# Altium footprint library CADTcommon.PcbLib: 503 footprints (part 2 of 32)
Each footprint in its own frame and in the unit in brackets; x right, y up, seen from the top. Pads: shape width x height; smd on the part's side, far side on the other; paste and mask are expansions set on the pad; w line width, h text height; cw(c..) or ccw(c..) is an arc to the next point about the centre after c.
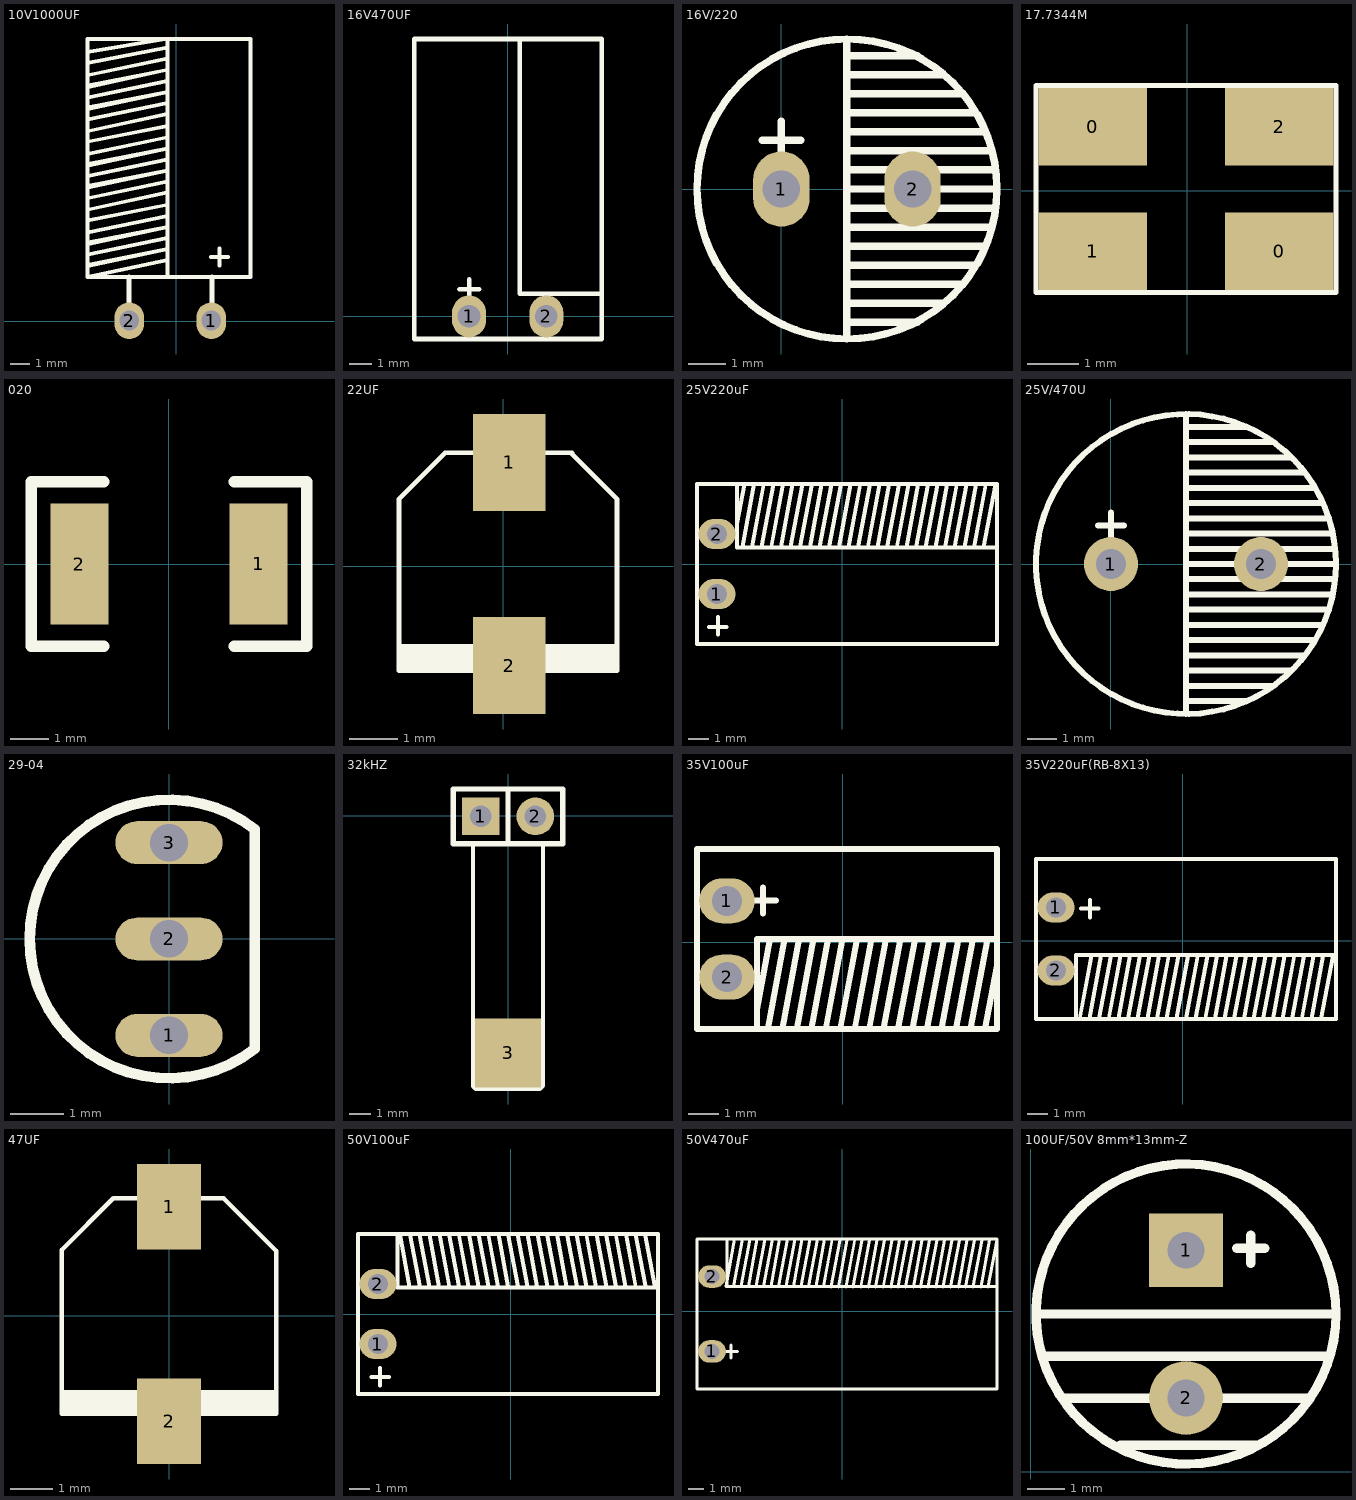
[diagram p1: the footprints below, top view; thin cyan lines are the x and y axes]

## 10V1000UF [mm]
pads (2):
  oval 1.5x1.85 hole 1: 1(1.778,0.025) 2(-2.362,0.025)
Top Overlay:
  lines w0.2: -4.47,2.845 -0.432,3.632 -4.445,2.769 ; -4.47,4.47 -0.432,5.309 ; -4.47,5.08 -0.432,5.867 ; -4.47,5.613 -0.457,6.477 ; -4.47,6.198 -0.432,7.036 ; -4.47,6.807 -0.432,7.595 -4.445,6.731 ; -4.47,8.433 -0.432,9.271 ; -4.47,9.042 -0.432,9.83 ; -4.47,9.576 -0.457,10.439 ; -4.47,10.16 -0.432,10.998 ; -4.47,10.77 -0.432,11.557 -4.445,10.693 ; -4.47,12.395 -0.432,13.233 ; -4.47,13.005 -0.432,13.792 ; -4.47,13.564 -0.559,14.224 ; -4.445,3.353 -0.441,4.184 ; -4.445,3.962 -0.432,4.75 -4.42,3.886 ; -4.445,7.315 -0.441,8.146 ; -4.445,7.925 -0.432,8.712 -4.42,7.849 ; -4.445,11.278 -0.441,12.109 ; -4.445,11.887 -0.432,12.675 -4.42,11.811 ; -0.432,3.073 -4.47,2.235 ; -0.432,14.199 -0.432,2.235 ; 1.768,3.226 2.631,3.226 ; 2.2,2.794 2.2,3.658 ; -4.47,2.235 -4.47,14.224 3.759,14.224 3.759,2.235 -0.432,2.235 ; -4.47,2.235 -0.432,2.235
  lines w0.254: -2.362,0.025 -2.362,2.235 ; 1.778,0.025 1.803,0.051 1.803,2.235 1.803,0.937
3D body: height 8, standoff -2.8, extent -4.404,-0.105 3.632,13.82

## 16V470UF [mm]
pads (2):
  oval 1.5x1.85 hole 1: 1(-1.702,0) 2(1.702,0)
Top Overlay:
  lines w0.2: -2.123,1.201 -1.26,1.201 ; -1.692,0.769 -1.692,1.633 ; 0.533,12.217 0.533,1.004 4.14,1.004 ; -4.115,-0.996 -4.115,12.217 4.14,12.217 4.14,-0.996 -4.115,-0.996

## 16V/220 [mm] "RB-8"
pads (2):
  oval 1.5x2 hole 1: 1(0,0) 2(3.5,0)
Top Overlay:
  circle w0.2: c1.75,0 r4
  lines w0.2: -0.505,1.295 0.511,1.295 ; 0.003,0.787 0.003,1.803 ; 1.75,-4 1.75,4 ; 1.75,-3.556 3.617,-3.556 ; 1.75,-3.048 4.329,-3.048 ; 1.75,-2.54 4.786,-2.54 ; 1.75,-2.032 5.167,-2.032 ; 1.75,-1.524 5.421,-1.524 ; 1.75,-1.016 5.599,-1.016 ; 1.75,-0.508 5.675,-0.508 ; 1.75,0 5.75,0 ; 1.75,0.508 5.675,0.508 ; 1.75,1.016 5.599,1.016 ; 1.75,1.524 5.421,1.524 ; 1.75,2.032 5.167,2.032 ; 1.75,2.54 4.786,2.54 ; 1.75,3.048 4.329,3.048 ; 1.75,3.556 3.617,3.556

## 17.7344M [mm]
pads (4):
  rect 2.1x1.5 smd: 0(-1.821,1.232) 0(1.779,-1.168) 1(-1.821,-1.168) 2(1.779,1.232)
Top Overlay:
  lines w0.1: -2.921,-1.968 -2.921,2.032 2.879,2.032 2.879,-1.968 -2.921,-1.968

## 020 [mil] "F"
pads (2):
  rect 60x125 smd: 1(92.5,0) 2(-92.5,0)
Top Overlay:
  lines w12: -67.5,-85 -142.5,-85 -142.5,85 -67.5,85 ; 67.5,-85 142.5,-85 142.5,85 67.5,85
3D body: height 36.61, standoff 0, extent -90.54,-63.3 90.56,63

## 22UF [mm] "C_LV_3"
pads (2):
  rect 1.5x2 smd: 1(0.127,2.151) 2(0.127,-2.049)
Top Overlay:
  lines w0.1: -2.148,-2.049 2.352,-2.049 ; -2.148,-1.999 2.352,-1.999 ; -2.148,-1.949 2.352,-1.949 ; -2.148,-1.849 2.352,-1.849 ; -2.148,-1.749 2.352,-1.749 ; -2.148,-1.699 2.352,-1.699 ; -2.148,-1.649 2.352,-1.649 ; -1.198,2.351 -2.148,1.401 -2.148,-2.149 2.352,-2.149 2.352,1.401 1.402,2.351 ; -1.173,2.351 1.427,2.351 ; -2.148,-1.899 2.352,-1.899 -2.148,-1.899 ; -2.148,-1.799 2.352,-1.799 -2.148,-1.799

## 25V220uF [mm]
pads (2):
  oval 1.85x1.5 hole 1: 1(-6.273,-1.486) 2(-6.273,1.514)
Top Overlay:
  lines w0.2: -6.664,-3.123 -5.8,-3.123 ; -6.232,-3.504 -6.232,-2.64 ; -5.273,4.014 -5.273,0.838 7.727,0.838 ; -5.272,2.039 -4.902,4.016 ; -5.008,0.864 -4.42,4.014 ; -4.526,0.863 -3.937,4.013 ; -4.043,0.862 -3.454,4.012 ; -3.561,0.861 -2.972,4.011 ; -3.078,0.86 -2.489,4.01 ; -2.595,0.858 -2.007,4.008 ; -2.113,0.857 -1.524,4.007 ; -1.63,0.856 -1.041,4.006 ; -1.148,0.855 -0.559,4.005 ; -0.665,0.854 -0.076,4.004 ; -0.182,0.852 0.406,4.002 ; 0.3,0.851 0.889,4.001 ; 0.783,0.85 1.372,4 ; 1.265,0.849 1.854,3.999 ; 1.748,0.848 2.337,3.998 ; 2.231,0.846 2.819,3.996 ; 2.713,0.845 3.302,3.995 ; 3.196,0.844 3.785,3.994 ; 3.678,0.843 4.267,3.993 ; 4.161,0.842 4.75,3.992 ; 4.644,0.84 5.232,3.99 ; 5.126,0.839 5.715,3.989 ; 5.609,0.838 6.198,3.988 ; 6.091,0.837 6.68,3.987 ; 7.057,0.834 7.645,3.984 ; -7.273,-3.986 -7.273,4.014 7.727,4.014 7.727,-3.986 -7.273,-3.986 ; 6.574,0.836 7.163,3.986 6.574,0.836
3D body: height 8, standoff -2.8, extent -6.556,-3.972 7.369,4.064

## 25V/470U [mm] "RB-10"
pads (2):
  round 1.8 hole 1: 1(0,0) 2(5,0)
Top Overlay:
  circle w0.2: c2.5,0 r5
  lines w0.2: -0.437,1.277 0.426,1.277 ; -0.005,0.845 -0.005,1.708 ; 2.5,-5 2.5,5 ; 2.5,-4.572 4.51,-4.572 ; 2.5,-4.064 5.374,-4.064 ; 2.5,-3.556 6.009,-3.556 ; 2.5,-3.048 6.441,-3.048 ; 2.5,-2.54 6.771,-2.54 ; 2.5,-2.032 7.025,-2.032 ; 2.5,-1.524 7.228,-1.524 ; 2.5,-1.016 7.355,-1.016 ; 2.5,-0.508 7.431,-0.508 ; 2.5,0 7.5,0 ; 2.5,0.508 7.431,0.508 ; 2.5,1.016 7.355,1.016 ; 2.5,1.524 7.228,1.524 ; 2.5,2.032 7.025,2.032 ; 2.5,2.54 6.771,2.54 ; 2.5,3.048 6.441,3.048 ; 2.5,3.556 6.009,3.556 ; 2.5,4.064 5.374,4.064 ; 2.5,4.572 4.51,4.572

## 29-04 [mm] "TO, Flat Index; 3 In-Line, Axial Leads; Body Dia. 4.8mm; Leads 0.48 x 0.5 mm (max)"
height 5.33
pads (3):
  oval 2x0.8 hole 0.7: 1(0,-1.8) 2(0,0) 3(0,1.8)
Top Overlay:
  lines w0.2: 1.601,-2.049 cw(c0,0) 1.601,2.049 ; 1.6,-1.99 1.6,1.99
3D body: height 8, standoff 3, extent -2.612,-2.6 1.657,2.602
3D body: height 3, standoff 0, extent -0.246,1.583 0.254,2.023
3D body: height 3, standoff 0, extent -0.25,-0.22 0.25,0.22
3D body: height 3, standoff 0, extent -0.25,-2.04 0.25,-1.6

## 32kHZ [mm]
pads (3):
  rect 1.75x1.75 hole 1: 1(-1.27,-0.025)
  round 1.75 hole 1: 2(1.27,-0.025)
  rect 3.08x3.2 smd: 3(0,-10.998)
Top Overlay:
  lines w0.2: -1.626,-1.27 -1.626,-1.676 -1.626,-12.548 -1.499,-12.675 1.473,-12.675 1.626,-12.522 1.626,-1.295 2.54,-1.295
  lines w0.254: 0,-1.295 0,1.245 ; -2.54,-1.295 2.54,-1.295 2.54,1.245 -2.54,1.245 -2.54,-1.295

## 35V100uF [mm]
pads (2):
  oval 1.85x1.5 hole 1: 1(-3.856,1.377) 2(-3.856,-1.163)
Top Overlay:
  lines w0.2: -3.092,1.387 -2.228,1.387 ; -2.858,-2.235 -2.42,0.109 ; -2.856,-2.893 -2.856,0.107 5.144,0.107 ; -2.66,0.955 -2.66,1.819 ; -2.494,-2.872 -1.938,0.104 ; -2.011,-2.873 -1.456,0.098 ; -1.529,-2.874 -0.971,0.108 ; -1.046,-2.875 -0.489,0.104 ; -0.563,-2.877 -0.005,0.108 ; -0.081,-2.878 0.477,0.104 ; 0.402,-2.879 0.961,0.113 ; 0.884,-2.88 1.443,0.108 ; 1.367,-2.881 1.926,0.108 ; 1.85,-2.883 2.404,0.083 ; 2.332,-2.884 2.892,0.112 ; 2.815,-2.885 3.373,0.103 ; 3.297,-2.886 3.858,0.113 ; 3.78,-2.887 4.34,0.108 ; 4.263,-2.889 4.822,0.103 ; 4.745,-2.89 5.139,-0.784 ; -4.856,-2.893 -4.856,3.107 5.144,3.107 5.144,-2.893 -4.856,-2.893
3D body: height 5.53, standoff 0.47, extent -8.44,-2.184 6.357,2.866

## 35V220uF(RB-8X13) [mm]
pads (2):
  oval 1.85x1.5 hole 1: 1(-6.35,1.663) 2(-6.35,-1.489)
Top Overlay:
  lines w0.2: -5.35,-3.913 -5.35,-0.711 7.65,-0.711 ; -5.161,-3.887 -4.572,-0.737 ; -5.089,1.599 -4.225,1.599 ; -4.678,-3.888 -4.089,-0.738 ; -4.657,1.167 -4.657,2.031 ; -4.196,-3.889 -3.607,-0.739 ; -3.713,-3.89 -3.124,-0.74 ; -3.23,-3.891 -2.642,-0.741 ; -2.748,-3.893 -2.159,-0.743 ; -2.265,-3.894 -1.676,-0.744 ; -1.783,-3.895 -1.194,-0.745 ; -1.3,-3.896 -0.711,-0.746 ; -0.817,-3.897 -0.229,-0.747 ; -0.335,-3.899 0.254,-0.749 ; 0.148,-3.9 0.737,-0.75 ; 0.63,-3.901 1.219,-0.751 ; 1.113,-3.902 1.702,-0.752 ; 1.596,-3.903 2.184,-0.753 ; 2.078,-3.905 2.667,-0.755 ; 2.561,-3.906 3.15,-0.756 ; 3.043,-3.907 3.632,-0.757 ; 3.526,-3.908 4.115,-0.758 ; 4.009,-3.909 4.597,-0.759 ; 4.491,-3.911 5.08,-0.761 ; 4.974,-3.912 5.563,-0.762 ; 5.456,-3.913 6.045,-0.763 ; 5.939,-3.914 6.528,-0.764 ; 6.904,-3.917 7.493,-0.767 ; -7.35,-3.913 7.65,-3.913 7.65,4.087 -7.35,4.087 -7.35,-3.913 ; 6.422,-3.915 7.01,-0.765 6.422,-3.915
3D body: height 5.53, standoff 0.47, extent -7.209,-2.413 7.589,2.638

## 47UF [mm]
pads (2):
  rect 1.5x2 smd: 1(0,2.54) 2(0,-2.46)
Top Overlay:
  lines w0.1: -2.5,-2.185 2.5,-2.185 ; -2.5,-2.135 2.5,-2.135 ; -2.5,-2.085 2,-2.085 ; -2.5,-1.985 2,-1.985 ; -2.5,-1.885 2,-1.885 ; -2.5,-1.835 2.5,-1.835 ; -2.5,-1.785 2.5,-1.785 ; -2.5,-2.285 -2.5,1.54 -1.3,2.74 1.275,2.74 2.5,1.515 2.5,-2.285 -2.5,-2.285 ; -2.5,-2.035 2.5,-2.035 -2.5,-2.035 ; -2.5,-1.935 2.5,-1.935 -2.5,-1.935

## 50V100uF [mm]
pads (2):
  oval 1.85x1.5 hole 1: 1(-6.629,-1.489) 2(-6.629,1.511)
Top Overlay:
  lines w0.2: -6.943,-3.125 -6.08,-3.125 ; -6.537,-3.557 -6.537,-2.694 ; -5.654,3.989 -5.654,1.346 7.346,1.346 ; -5.537,3.988 -5.047,1.367 ; -5.029,3.988 -4.539,1.366 ; -4.547,3.988 -4.056,1.365 ; -4.064,3.988 -3.573,1.364 ; -3.556,4.013 -3.068,1.402 ; -3.073,4.013 -2.584,1.396 ; -2.591,4.013 -2.1,1.385 ; -2.083,4.013 -1.593,1.393 ; -1.6,4.013 -1.11,1.392 ; -1.118,4.013 -0.626,1.382 ; -0.61,4.013 -0.119,1.39 ; -0.127,4.013 0.364,1.389 ; 0.356,4.013 0.848,1.379 ; 0.838,4.013 1.329,1.387 ; 1.346,4.013 1.838,1.381 ; 1.829,4.013 2.321,1.38 ; 2.311,4.013 2.803,1.383 ; 2.819,4.013 3.311,1.382 ; 3.302,4.013 3.795,1.376 ; 3.785,4.013 4.279,1.37 ; 4.293,4.013 4.787,1.369 ; 4.775,4.013 5.269,1.373 ; 5.258,4.013 5.751,1.376 ; 5.766,4.013 6.26,1.37 ; 6.731,4.013 7.225,1.368 ; -7.629,-3.989 -7.629,4.011 7.371,4.011 7.371,-3.989 -7.629,-3.989 ; 6.248,4.013 6.736,1.407 6.248,4.013
3D body: height 7.8, standoff -3, extent -7.16,-3.949 6.764,4.087

## 50V470uF [mm]
pads (2):
  oval 1.85x1.5 hole 1: 1(-8.698,-2.668) 2(-8.698,2.332)
Top Overlay:
  lines w0.2: -7.854,-2.662 -6.99,-2.662 ; -7.772,1.676 -7.184,4.826 ; -7.698,4.832 -7.698,1.674 10.302,1.674 ; -7.422,-3.094 -7.422,-2.23 ; -7.264,1.676 -6.676,4.826 ; -6.756,1.676 -6.168,4.826 ; -6.274,1.676 -5.685,4.826 ; -5.766,1.676 -5.177,4.826 ; -5.258,1.676 -4.669,4.826 ; -4.775,1.676 -4.186,4.826 ; -4.267,1.676 -3.678,4.826 ; -3.759,1.676 -3.17,4.826 ; -3.277,1.676 -2.688,4.826 ; -2.769,1.676 -2.18,4.826 ; -2.261,1.676 -1.672,4.826 ; -1.778,1.676 -1.189,4.826 ; -1.27,1.676 -0.681,4.826 ; -0.762,1.626 -0.173,4.776 ; -0.279,1.626 0.309,4.776 ; 0.229,1.626 0.817,4.776 ; 0.711,1.626 1.3,4.776 ; 1.219,1.626 1.808,4.776 ; 1.727,1.626 2.316,4.776 ; 2.21,1.626 2.799,4.776 ; 2.718,1.626 3.307,4.776 ; 3.226,1.626 3.815,4.776 ; 3.708,1.626 4.297,4.776 ; 4.724,1.626 5.313,4.776 ; 5.207,1.626 5.796,4.776 ; 5.715,1.626 6.304,4.776 ; 6.223,1.626 6.812,4.776 ; 6.706,1.626 7.294,4.776 ; 7.214,1.626 7.802,4.776 ; 7.722,1.626 8.31,4.776 ; 8.204,1.626 8.793,4.776 ; 8.712,1.626 9.301,4.776 ; 9.22,1.626 9.809,4.776 ; 9.703,1.626 10.292,4.776 ; -9.698,-5.168 10.302,-5.168 10.302,4.832 -9.698,4.832 -9.698,-5.168 ; 4.216,1.626 4.805,4.776 4.216,1.626

## 100UF/50V 8mm*13mm-Z [mm]
pads (2):
  rect 2x2 hole 1: 1(4.204,6)
  round 2 hole 1: 2(4.204,2)
Top Overlay:
  circle w0.254: c4.204,4.274 r4.064
  lines w0.254: 0.14,4.274 8.268,4.274 ; 0.394,3.131 8.014,3.131 ; 0.902,1.988 7.506,1.988 ; 2.426,0.718 6.109,0.718 ; 5.576,6.052 6.338,6.052 ; 5.957,5.646 5.957,6.408